# Altium footprint library PCBLIB.PcbLib: 557 footprints (part 29 of 36)
Each footprint in its own frame and in the unit in brackets; x right, y up, seen from the top. Pads: shape width x height; smd on the part's side, far side on the other; paste and mask are expansions set on the pad; w line width, h text height; cw(c..) or ccw(c..) is an arc to the next point about the centre after c.
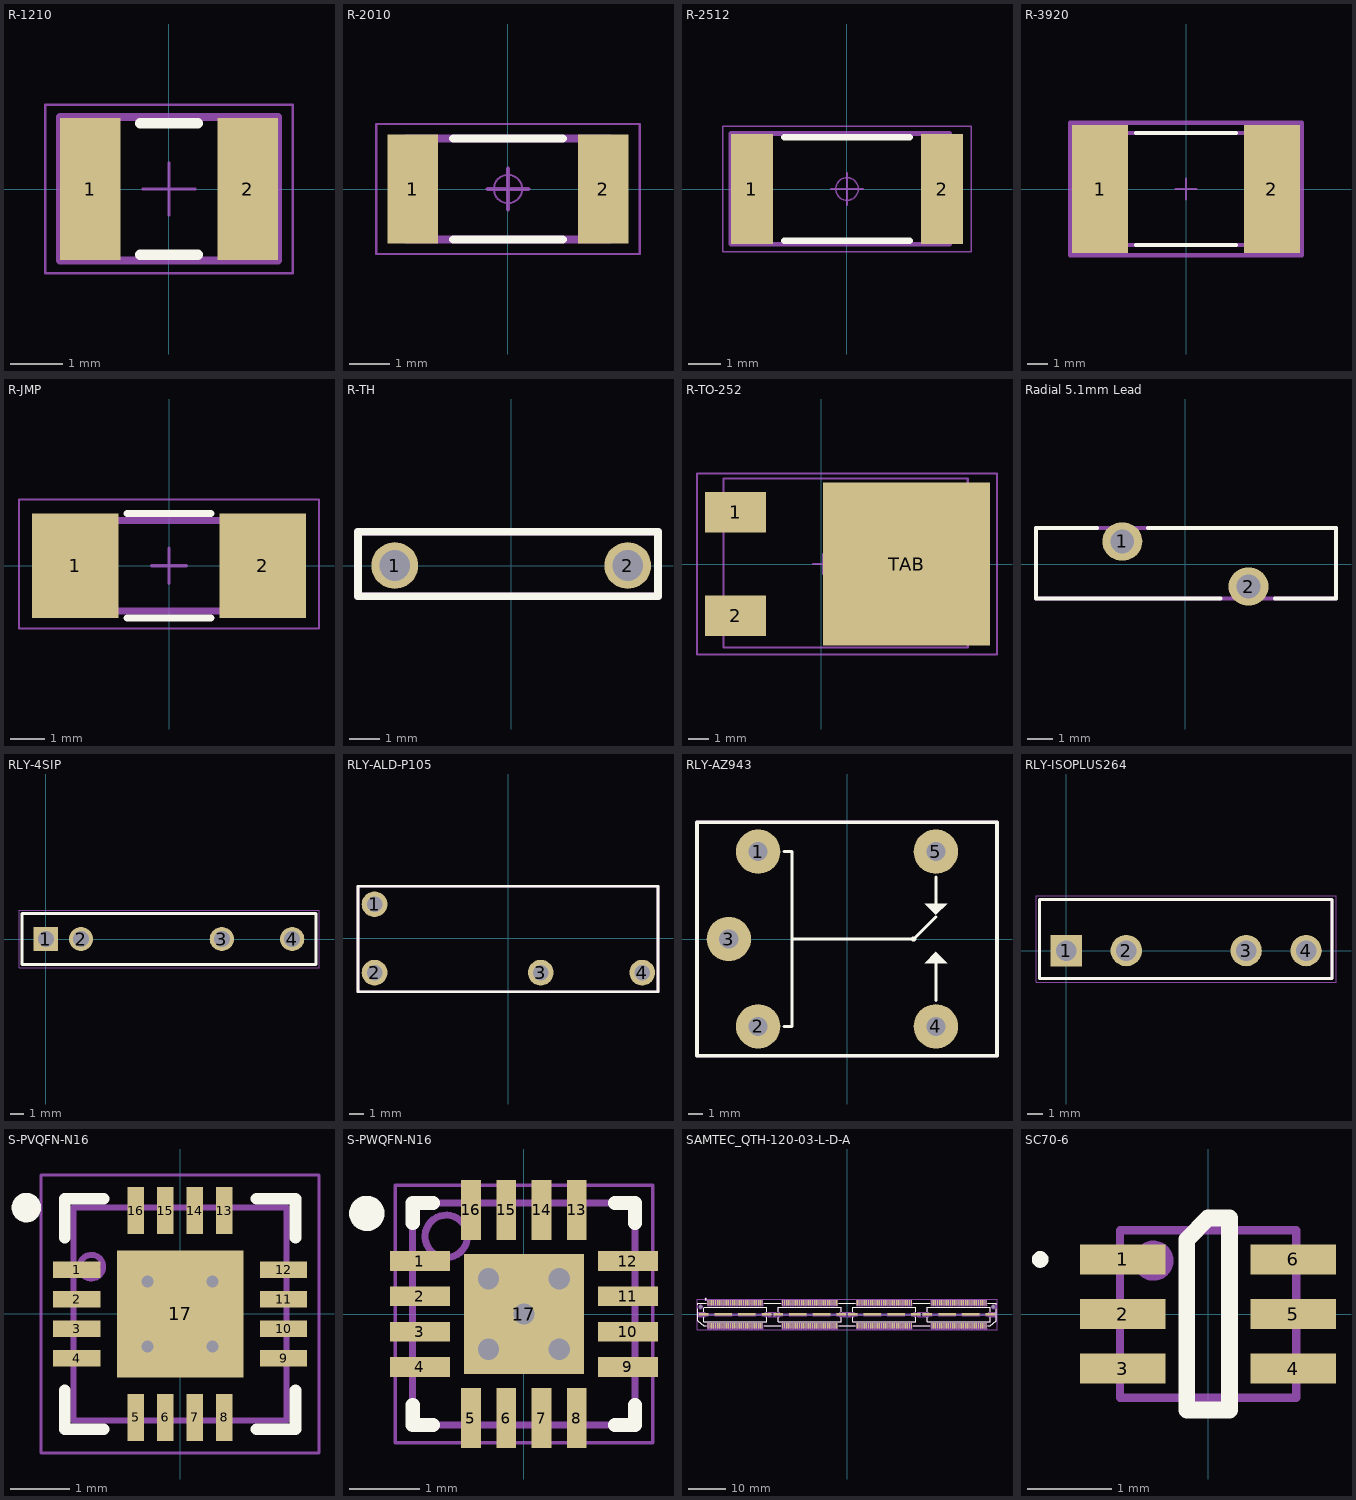
[diagram p28: the footprints below, top view; thin cyan lines are the x and y axes]

## R-1210 [mm]
pads (2):
  rect 1.15x2.7 smd: 1(-1.5,0) 2(1.5,0)
Top Overlay:
  lines w0.2: -0.55,-1.25 0.55,-1.25 ; -0.55,1.25 0.55,1.25
Mechanical 15:
  lines w0.05: -0.5,0 0.5,0 ; 0,-0.5 0,0.5 ; -2.35,-1.6 2.35,-1.6 2.35,1.6 -2.35,1.6 -2.35,-1.6
ASM Top:
  lines w0.152: -2.075,-1.358 2.075,-1.358 2.075,1.367 -2.075,1.367 -2.075,-1.358
  text ".designator" at -0.499,-0.247 h0.8
3D body "User Library-SMD RESISTOR-1.STEP": height 0.61, standoff 0.01, extent -1.6,-1.25 1.6,1.25

## R-2010 [mm]
height 0.65
pads (2):
  rect 1.25x2.7 smd: 1(-2.35,0) 2(2.35,0)
Top Overlay:
  lines w0.2: -1.35,-1.25 1.35,-1.25 ; -1.35,1.25 1.35,1.25
Mechanical 15:
  circle w0.05: c0,0 r0.35
  lines w0.05: -0.5,0 0.5,0 ; 0,-0.5 0,0.5 ; -3.25,-1.6 3.25,-1.6 3.25,1.6 -3.25,1.6 -3.25,-1.6
Mechanical 16:
  lines w0.1: -0.5,0 0.5,0 ; 0,-0.5 0,0.5
ASM Top:
  lines w0.2: -2.5,-1.25 -2.5,1.25 2.5,1.25 2.5,-1.25 -2.5,-1.25
  text ".designator" at -0.47,-0.181 h0.8
3D body "Res_TE_CRGP2010F820K_eec.STEP": height 0.65, standoff 0, extent -2.5,-1.25 2.5,1.25

## R-2512 [mm]
pads (2):
  rect 1.3x3.4 smd: 1(-2.95,0) 2(2.95,0)
Top Overlay:
  lines w0.2: -1.95,-1.6 1.95,-1.6 ; -1.95,1.6 1.95,1.6
Mechanical 15:
  circle w0.05: c0,0 r0.35
  lines w0.05: -0.5,0 0.5,0 ; 0,-0.5 0,0.5 ; -3.85,-1.95 3.85,-1.95 3.85,1.95 -3.85,1.95 -3.85,-1.95
ASM Top:
  lines w0.152: -3.6,-1.712 3.185,-1.712 3.185,1.725 -3.6,1.725 -3.6,-1.712
  text ".designator" at -0.85,-0.429 h0.8
3D body "RESC6332X80N.stp": height 0.8, standoff 0, extent -3.125,-1.6 3.125,1.6

## R-3920 [mm]
pads (2):
  rect 2.7x6.2 smd paste+0 mask+0: 1(-4.15,0) 2(4.15,0)
Top Overlay:
  lines w0.2: -2.425,-2.7 2.425,-2.7 ; -2.425,2.7 2.425,2.7
Mechanical 15:
  lines w0.2: -5.6,-3.2 -5.6,3.2 5.6,3.2 5.6,-3.2 -5.6,-3.2
Mechanical 16:
  lines w0.1: -0.5,0 0.5,0 ; 0,-0.5 0,0.5
ASM Top:
  lines w0.2: -5.2,-2.7 5.2,-2.7 5.2,2.7 -5.2,2.7 -5.2,-2.7
  text ".Designator" at 0,0.188 h1
3D body "Res_Stackpole_Electronics_HCS3920FT1L00_eec.STEP": height 1.07, standoff 0, extent -5.1,-2.6 5.1,2.6

## R-JMP [mm] "Chip Resistor, 2-Leads, Body 6.85x2.00mm, IPC Medium Density"
height 0.97
pads (2):
  rect 2.475x3 smd: 1(-2.688,0) 2(2.688,0)
Top Overlay:
  lines w0.2: -1.2,-1.5 1.2,-1.5 ; -1.2,1.5 1.2,1.5
Mechanical 15:
  lines w0.05: -4.3,-1.8 4.3,-1.8 4.3,1.9 -4.3,1.9 -4.3,-1.8
  lines w0.1: -0.5,0 0.5,0 ; 0,-0.5 0,0.5
ASM Top:
  lines w0.2: -3.4,-1.3 3.3,-1.3 3.3,1.3 3.1,1.3 -3.4,1.3 -3.4,-1.3
  text ".designator" at -0.5,-0.3 h0.8
3D body "s1911-46r.stp": height 0.98, standoff 0.01, extent -3.425,-1.25 3.425,1.257

## R-TH [mil]
pads (2):
  round 60 hole 39.37: 1(-149.61,0) 2(150,0)
Top Overlay:
  lines w10: -196.85,-39.37 -196.85,43.31 188.98,43.31 188.98,-39.37 -196.85,-39.37
Bottom Overlay:
  lines w10: -196.85,-39.37 -196.85,43.31 188.98,43.31 188.98,-39.37 -196.85,-39.37
Top 3D Body:
  lines w10: -196.85,-39.37 -196.85,0 -196.85,43.31 188.98,43.31 188.98,-39.37 -196.85,-39.37
ASM Top:
  lines w5.91: -196.85,-39.37 188.98,-39.37 188.98,43.31 -196.85,43.31 -196.85,-39.37
  text ".designator" at -31.5,-11.81 h31.5
3D body "CircuitWorks-RESISTOR 7_62MM DIP.STEP": height 157.98, standoff 0.5, extent -157.48,-39.37 161.42,39.37

## R-TO-252 [mm]
pads (3):
  rect 3x2 smd paste-0.05: 1(-4.2,2.54) 2(-4.2,-2.54)
  rect 8.2x8 smd paste-10: TAB(4.2,0)
Top Paste:
  rectangle: 5.715,2.159 8.128,3.683
  rectangle: 5.715,0.212 8.128,1.736
  rectangle: 5.715,-1.736 8.128,-0.212
  rectangle: 5.715,-3.683 8.128,-2.159
  rectangle: 2.984,2.159 5.397,3.683
  rectangle: 2.984,0.212 5.397,1.736
  rectangle: 2.984,-1.736 5.397,-0.212
  rectangle: 2.984,-3.683 5.397,-2.159
  rectangle: 0.254,-3.683 2.667,-2.159
  rectangle: 0.254,-1.736 2.667,-0.212
  rectangle: 0.254,0.212 2.667,1.736
  rectangle: 0.254,2.159 2.667,3.683
Mechanical 15:
  lines w0.1: -0.4,0 0.6,0 ; 0.1,-0.5 0.1,0.5 ; -6.096,-4.445 8.636,-4.445 8.636,4.445 -6.096,4.445 -6.096,-4.445
ASM Top:
  lines w0.1: -4.8,-4.1 -4.8,4.2 7.2,4.2 7.2,-4.1 -4.8,-4.1
  text ".designator" at 0,0 h0.8
3D body "TKH45PR500JE-TR.stp": height 0.92, standoff 0.01, extent -4.78,-4.15 7.22,4.15

## Radial 5.1mm Lead [mm] "Poly Puse"
pads (2):
  oval 1.6x1.524 hole 0.95: 1(-2.525,0.903) 2(2.525,-0.903)
Top Overlay:
  lines w0.152: -3.527,1.436 -5.976,1.436 -5.976,-1.383 ; -1.503,1.434 -1.501,1.436 6.024,1.436 6.024,-1.383 3.576,-1.383 3.573,-1.38 ; 1.41,-1.384 -5.976,-1.384 ; -5.976,-1.383 -5.976,-1.384
ASM Top:
  lines w0.15: -5.976,1.436 6.024,1.436 6.024,-1.383 -5.976,-1.383 -5.976,1.4 ; -5.976,1.4 -5.976,1.4
  text ".designator" at -1,-0.1 h0.8
3D body "User Library-MF-R250.STEP": height 18.3, standoff -7.6, extent -5.976,-1.383 6.024,1.436

## RLY-4SIP [mm]
pads (4):
  rect 1.75x1.75 hole 1.15: 1(0,0)
  round 1.75 hole 1.15: 2(2.54,0) 3(12.7,0) 4(17.78,0)
Top Overlay:
  lines w0.2: -1.71,-1.85 -1.71,1.85 19.49,1.85 19.49,-1.85 -1.71,-1.85
Mechanical 15:
  lines w0.05: -1.935,-2.075 -1.935,2.075 19.715,2.075 19.715,-2.075 -1.935,-2.075
ASM Top:
  lines w0.1: -1.71,-1.85 19.49,-1.85 19.49,1.85 -1.71,1.85 -1.71,-1.85
  text ".designator" at 7.1,0 h1.5
3D body: height 12.6, standoff 1.4, extent -1.71,-1.85 19.49,1.85

## RLY-ALD-P105 [mil]
pads (4):
  round 70 hole 42: 1(-364,93) 2(-364,-93) 3(88,-93) 4(364,-93)
Top Overlay:
  lines w8: -409,-145 -409,142 403,142 407,142 407,-145 -409,-145
ASM Top:
  lines w8: -409,-145 -409,142 407,142 407,-145 -409,-145
  text ".designator" at -301,-11 h31.5
3D body: height 602.36, standoff 11.81, extent -400.54,-146.73 406.54,136.74

## RLY-AZ943 [mil]
pads (5):
  round 120 hole 52: 1(-240,236) 2(-240,-236) 3(-319,0) 4(240,-236) 5(240,236)
Top Overlay:
  circle w4: c180,0 r5.39
  region: 270,-65 240,-35 210,-65
  region: 279,95
  region: 210,95 240,65 270,95
  lines w8: -170,-236 -149,-236 -149,236 -170,236 ; -147,0 180,0 240,60 ; 240,-166 240,-64 ; 240,94 240,114 240,167
  lines w10: -405,-315 -405,315 405,315 405,-315 -405,-315
ASM Top:
  lines w10: -405,315 405,315 405,-315 -405,-315 -405,314 -404,315
  text ".designator" at -244,78 h31.5
3D body "AZ943-1CH-5DE-Relay.step": height 602.36, standoff -196.85, extent -376,-305.23 375.97,305

## RLY-ISOPLUS264 [mm] "SIL, 4-Leads, Body 21x3.5mm"
height 12.6
pads (4):
  rect 2x2 hole 1.3: 1(0,0)
  round 2 hole 1.3: 2(3.81,0) 3(11.43,0) 4(15.24,0)
Top Overlay:
  lines w0.2: -1.71,-1.778 -1.71,3.247 16.891,3.247 16.891,-1.778 -1.71,-1.778
Mechanical 13:
  lines w0.1: -1.71,-1.778 16.891,-1.778 16.891,3.247 -1.71,3.247 -1.71,-1.778
Mechanical 15:
  lines w0.05: -1.935,-2 -1.935,3.472 17.145,3.472 17.145,-2 -1.935,-2
ASM Top:
  lines w0.2: -1.71,3.247 -1.71,-1.778 16.891,-1.778 16.891,3.247
  text ".designator" at 6.4,0.7 h1.5

## S-PVQFN-N16 [mm] "QFN, 16-Leads, Body 3,50x3,50mm, Pitch 0,50mm, Thermal Pad 2,14x2,14mm, IPC Medium Density"
height 1
pads (17):
  rect 0.8x0.28 smd: 1(-1.75,0.75) 2(-1.75,0.25) 3(-1.75,-0.25) 4(-1.75,-0.75) 9(1.75,-0.75) 10(1.75,-0.25) 11(1.75,0.25) 12(1.75,0.75)
  rect 0.28x0.8 smd: 5(-0.75,-1.75) 6(-0.25,-1.75) 7(0.25,-1.75) 8(0.75,-1.75) 13(0.75,1.75) 14(0.25,1.75) 15(-0.25,1.75) 16(-0.75,1.75)
  rect 2.14x2.14 smd: 17(0,0)
via -0.55,0.55 diameter 0.5 hole 0.2
via 0.55,0.55 diameter 0.5 hole 0.2
via -0.55,-0.55 diameter 0.5 hole 0.2
via 0.55,-0.55 diameter 0.5 hole 0.2
Top Overlay:
  circle w0.25: c-2.6,1.8 r0.125
  lines w0.2: -1.95,-1.29 -1.95,-1.95 -1.29,-1.95 ; -1.95,1.29 -1.95,1.95 -1.29,1.95 ; 1.29,-1.95 1.95,-1.95 1.95,-1.29 ; 1.29,1.95 1.95,1.95 1.95,1.29
Mechanical 15:
  lines w0.05: -2.35,-2.35 -2.35,2.35 2.35,2.35 2.35,-2.35 -2.35,-2.35
  lines w0.1: -0.5,0 0.5,0 ; 0,-0.5 0,0.5
ASM Top:
  circle w0.1: c-1.5,0.8 r0.2
  lines w0.1: -1.8,-1.8 -1.8,1.8 1.8,1.8 1.8,-1.8 -1.8,-1.8
  text ".designator" at -1.5,-0.6 h0.8
3D body "S-PVQFN-N16.step": height 1, standoff 0, extent -1.88,-1.88 1.88,1.88

## S-PWQFN-N16 [mm] "PQFN, 16-Leads, Body 3,00x3,00mm, Pitch 0,50mm, Thermal Pad 1,70x1,70mm, IPC Medium Density"
height 0.8
pads (17):
  rect 0.85x0.28 smd: 1(-1.475,0.75) 2(-1.475,0.25) 3(-1.475,-0.25) 4(-1.475,-0.75) 9(1.475,-0.75) 10(1.475,-0.25) 11(1.475,0.25) 12(1.475,0.75)
  rect 0.28x0.85 smd: 5(-0.75,-1.475) 6(-0.25,-1.475) 7(0.25,-1.475) 8(0.75,-1.475) 13(0.75,1.475) 14(0.25,1.475) 15(-0.25,1.475) 16(-0.75,1.475)
  rect 1.7x1.7 smd: 17(0,0)
via -0.5,0.5 diameter 0.3 hole 0.3
via 0.5,0.5 diameter 0.3 hole 0.3
via 0.5,-0.5 diameter 0.3 hole 0.3
via -0.5,-0.5 diameter 0.3 hole 0.3
via 0,0 diameter 0.3 hole 0.3
Top Overlay:
  circle w0.25: c-2.225,1.425 r0.125
  lines w0.2: -1.575,-1.29 -1.575,-1.575 -1.29,-1.575 ; -1.575,1.29 -1.575,1.575 -1.29,1.575 ; 1.29,-1.575 1.575,-1.575 1.575,-1.29 ; 1.29,1.575 1.575,1.575 1.575,1.29
Mechanical 15:
  lines w0.05: -1.825,-1.825 1.825,-1.825 1.825,1.825 -1.825,1.825 -1.825,-1.825
  lines w0.1: -0.5,0 0.5,0 ; 0,-0.5 0,0.5
ASM Top:
  circle w0.1: c-1.1,1.1 r0.3
  lines w0.1: -1.575,-1.575 1.575,-1.575 1.575,1.575 -1.575,1.575 -1.575,-1.575
  text ".designator" at -1.4,-0.9 h0.8
3D body "S-PWQFN-N16.step": height 0.8, standoff 0, extent -1.575,-1.575 1.575,1.575

## SAMTEC_QTH-120-03-L-D-A [mm] "240  (4x60) Contacts, Pitch 0.5mm, Straight Double Row High Speed Ground Plane Header (Lead Style 10.27mm)"
height 10.27
pads (258):
  rect 0.305x1.45 smd mask+0: 1(-37.255,3.086) 2(-37.255,-3.086) 3(-36.755,3.086) 4(-36.755,-3.086) 5(-36.255,3.086) 6(-36.255,-3.086) 7(-35.755,3.086) 8(-35.755,-3.086) 9(-35.255,3.086) 10(-35.255,-3.086) 11(-34.755,3.086) 12(-34.755,-3.086) 13(-34.255,3.086) 14(-34.255,-3.086) 15(-33.755,3.086) 16(-33.755,-3.086) 17(-33.255,3.086) 18(-33.255,-3.086) 19(-32.755,3.086) 20(-32.755,-3.086) 21(-32.255,3.086) 22(-32.255,-3.086) 23(-31.755,3.086) 24(-31.755,-3.086) 25(-31.255,3.086) 26(-31.255,-3.086) 27(-30.755,3.086) 28(-30.755,-3.086) 29(-30.255,3.086) 30(-30.255,-3.086) 31(-29.755,3.086) 32(-29.755,-3.086) 33(-29.255,3.086) 34(-29.255,-3.086) 35(-28.755,3.086) 36(-28.755,-3.086) 37(-28.255,3.086) 38(-28.255,-3.086) 39(-27.755,3.086) 40(-27.755,-3.086) 41(-27.255,3.086) 42(-27.255,-3.086) 43(-26.755,3.086) 44(-26.755,-3.086) 45(-26.255,3.086) 46(-26.255,-3.086) 47(-25.755,3.086) 48(-25.755,-3.086) 49(-25.255,3.086) 50(-25.255,-3.086) 51(-24.755,3.086) 52(-24.755,-3.086) 53(-24.255,3.086) 54(-24.255,-3.086) 55(-23.755,3.086) 56(-23.755,-3.086) 57(-23.255,3.086) 58(-23.255,-3.086) 59(-22.755,3.086) 60(-22.755,-3.086) 61(-17.252,3.086) 62(-17.252,-3.086) 63(-16.752,3.086) 64(-16.752,-3.086) 65(-16.252,3.086) 66(-16.252,-3.086) 67(-15.752,3.086) 68(-15.752,-3.086) 69(-15.252,3.086) 70(-15.252,-3.086) 71(-14.752,3.086) 72(-14.752,-3.086) 73(-14.252,3.086) 74(-14.252,-3.086) 75(-13.752,3.086) 76(-13.752,-3.086) 77(-13.252,3.086) 78(-13.252,-3.086) 79(-12.752,3.086) 80(-12.752,-3.086) 81(-12.252,3.086) 82(-12.252,-3.086) 83(-11.752,3.086) 84(-11.752,-3.086) 85(-11.252,3.086) 86(-11.252,-3.086) 87(-10.752,3.086) 88(-10.752,-3.086) 89(-10.252,3.086) 90(-10.252,-3.086) 91(-9.752,3.086) 92(-9.752,-3.086) 93(-9.252,3.086) 94(-9.252,-3.086) 95(-8.752,3.086) 96(-8.752,-3.086) 97(-8.252,3.086) 98(-8.252,-3.086) 99(-7.752,3.086) 100(-7.752,-3.086) 101(-7.252,3.086) 102(-7.252,-3.086) 103(-6.752,3.086) 104(-6.752,-3.086) 105(-6.252,3.086) 106(-6.252,-3.086) 107(-5.752,3.086) 108(-5.752,-3.086) 109(-5.252,3.086) 110(-5.252,-3.086) 111(-4.752,3.086) 112(-4.752,-3.086) 113(-4.252,3.086) 114(-4.252,-3.086) 115(-3.752,3.086) 116(-3.752,-3.086) 117(-3.252,3.086) 118(-3.252,-3.086) 119(-2.752,3.086) 120(-2.752,-3.086) 121(2.752,3.086) 122(2.752,-3.086) 123(3.251,3.086) 124(3.251,-3.086) 125(3.751,3.086) 126(3.751,-3.086) 127(4.252,3.086) 128(4.252,-3.086) 129(4.751,3.086) 130(4.751,-3.086) 131(5.252,3.086) 132(5.252,-3.086) 133(5.751,3.086) 134(5.751,-3.086) 135(6.251,3.086) 136(6.251,-3.086) 137(6.752,3.086) 138(6.752,-3.086) 139(7.251,3.086) 140(7.251,-3.086) 141(7.752,3.086) 142(7.752,-3.086) 143(8.251,3.086) 144(8.251,-3.086) 145(8.751,3.086) 146(8.751,-3.086) 147(9.252,3.086) 148(9.252,-3.086) 149(9.751,3.086) 150(9.751,-3.086) 151(10.252,3.086) 152(10.252,-3.086) 153(10.751,3.086) 154(10.751,-3.086) 155(11.251,3.086) 156(11.251,-3.086) 157(11.752,3.086) 158(11.752,-3.086) 159(12.251,3.086) 160(12.251,-3.086) 161(12.751,3.086) 162(12.751,-3.086) 163(13.252,3.086) 164(13.252,-3.086) 165(13.751,3.086) 166(13.751,-3.086) 167(14.252,3.086) 168(14.252,-3.086) 169(14.751,3.086) 170(14.751,-3.086) 171(15.251,3.086) 172(15.251,-3.086) 173(15.752,3.086) 174(15.752,-3.086) 175(16.251,3.086) 176(16.251,-3.086) 177(16.751,3.086) 178(16.751,-3.086) 179(17.252,3.086) 180(17.252,-3.086) 181(22.755,3.086) 182(22.755,-3.086) 183(23.255,3.086) 184(23.255,-3.086) 185(23.755,3.086) 186(23.755,-3.086) 187(24.255,3.086) 188(24.255,-3.086) 189(24.755,3.086) 190(24.755,-3.086) 191(25.255,3.086) 192(25.255,-3.086) 193(25.755,3.086) 194(25.755,-3.086) 195(26.255,3.086) 196(26.255,-3.086) 197(26.755,3.086) 198(26.755,-3.086) 199(27.255,3.086) 200(27.255,-3.086) 201(27.755,3.086) 202(27.755,-3.086) 203(28.255,3.086) 204(28.255,-3.086) 205(28.755,3.086) 206(28.755,-3.086) 207(29.255,3.086) 208(29.255,-3.086) 209(29.755,3.086) 210(29.755,-3.086) 211(30.255,3.086) 212(30.255,-3.086) 213(30.755,3.086) 214(30.755,-3.086) 215(31.255,3.086) 216(31.255,-3.086) 217(31.755,3.086) 218(31.755,-3.086) 219(32.255,3.086) 220(32.255,-3.086) 221(32.755,3.086) 222(32.755,-3.086) 223(33.255,3.086) 224(33.255,-3.086) 225(33.755,3.086) 226(33.755,-3.086) 227(34.255,3.086) 228(34.255,-3.086) 229(34.755,3.086) 230(34.755,-3.086) 231(35.255,3.086) 232(35.255,-3.086) 233(35.755,3.086) 234(35.755,-3.086) 235(36.255,3.086) 236(36.255,-3.086) 237(36.755,3.086) 238(36.755,-3.086) 239(37.255,3.086) 240(37.255,-3.086)
  rect 2.54x0.64 smd mask+0: 241(-38.45,0) 244(-21.56,0) 245(-18.447,0) 248(-1.557,0) 249(1.557,0) 252(18.447,0) 253(21.56,0) 256(38.45,0)
  rect 4.7x0.64 smd mask+0: 242(-33.18,0) 243(-26.83,0) 246(-13.177,0) 247(-6.827,0) 250(6.827,0) 251(13.177,0) 254(26.83,0) 255(33.18,0)
  round 0.5 hole 1 unplated mask+0.25: 257(-39.245,2.032) 258(39.245,2.032)
Top Overlay:
  circle w0.25: c-37.897,4.047 r0.125
  lines w0.2: -39.977,1.509 -39.977,-1.639 -38.454,-2.982 -37.807,-2.982 ; -39.977,2.555 -39.977,2.982 -37.807,2.982 ; -38.424,-0.72 -38.424,-1.967 -21.543,-1.967 -21.543,-0.72 ; -38.424,0.72 -38.424,1.664 ; -38.347,1.967 -21.543,1.967 -21.543,0.72 ; -22.202,-2.982 -17.804,-2.982 ; -22.202,2.982 -17.804,2.982 ; -18.437,-0.72 -18.437,-1.967 -1.556,-1.967 -1.556,-0.72 ; -18.437,0.72 -18.437,1.967 -1.556,1.967 -1.556,0.72 ; -2.199,-2.982 2.199,-2.982 ; -2.199,2.982 2.199,2.982 ; 1.551,-0.72 1.551,-1.967 18.431,-1.967 18.431,-0.72 ; 1.551,0.72 1.551,1.967 18.431,1.967 18.431,0.72 ; 17.804,-2.982 22.202,-2.982 ; 17.804,2.982 22.202,2.982 ; 21.538,-0.72 21.538,-1.967 38.419,-1.967 38.419,-0.72 ; 21.538,0.72 21.538,1.967 38.347,1.967 ; 37.807,-2.982 38.449,-2.982 39.972,-1.639 39.972,1.502 ; 37.807,2.982 39.972,2.982 39.972,2.562 ; 38.419,0.72 38.419,1.675
Mechanical 8:
  drawing of 1550 lines, arcs and shapes, not listed
Mechanical 14:
  circle w0.1: c-37.895,4.047 r0.25
  lines w0.1: -38.708,-0.19 -39.438,-0.19 -39.438,0.19 -38.708,0.19 ; -38.424,-0.571 -38.008,-0.571 -38.008,-0.193 -38.159,-0.193 -38.159,0.193 -38.008,0.193 -38.008,0.571 -38.424,0.571 ; -21.543,-0.571 -21.959,-0.571 -21.959,-0.193 -21.808,-0.193 -21.808,0.193 -21.959,0.193 -21.959,0.571 -21.543,0.571 ; -21.069,-0.19 -20.529,-0.19 -20.529,0.19 -21.069,0.19 ; -18.911,-0.19 -19.451,-0.19 -19.451,0.19 -18.911,0.19 ; -18.437,-0.571 -18.02,-0.571 -18.02,-0.193 -18.171,-0.193 -18.171,0.193 -18.02,0.193 -18.02,0.571 -18.437,0.571 ; -1.556,-0.571 -1.972,-0.571 -1.972,-0.193 -1.821,-0.193 -1.821,0.193 -1.972,0.193 -1.972,0.571 -1.556,0.571 ; -1.081,-0.19 -0.542,-0.19 -0.542,0.19 -1.081,0.19 ; 1.076,-0.19 0.537,-0.19 0.537,0.19 1.076,0.19 ; 1.551,-0.571 1.967,-0.571 1.967,-0.193 1.816,-0.193 1.816,0.193 1.967,0.193 1.967,0.571 1.551,0.571 ; 18.431,-0.571 18.015,-0.571 18.015,-0.193 18.166,-0.193 18.166,0.193 18.015,0.193 18.015,0.571 18.431,0.571 ; 18.906,-0.19 19.445,-0.19 19.445,0.19 18.906,0.19 ; 21.063,-0.19 20.524,-0.19 20.524,0.19 21.063,0.19 ; 21.538,-0.571 21.954,-0.571 21.954,-0.193 21.803,-0.193 21.803,0.193 21.954,0.193 21.954,0.571 21.538,0.571 ; 38.419,-0.571 38.003,-0.571 38.003,-0.193 38.154,-0.193 38.154,0.193 38.003,0.193 38.003,0.571 38.419,0.571 ; 38.703,-0.19 39.433,-0.19 39.433,0.19 38.703,0.19 ; -39.977,-1.639 -39.977,2.982 39.972,2.982 39.972,-1.639 38.449,-2.982 -38.454,-2.982 -39.977,-1.639 ; -39.723,-0.635 -39.723,0.631 -38.708,0.631 -38.708,-0.635 -39.723,-0.635 ; -38.424,-1.967 -38.424,1.967 -21.543,1.967 -21.543,-1.967 -38.424,-1.967 ; -38.156,-0.19 -38.156,0.19 -21.811,0.19 -21.811,-0.19 -38.156,-0.19 ; -21.069,-0.635 -21.069,0.635 -18.911,0.635 -18.911,-0.635 -21.069,-0.635 ; -18.437,-1.967 -18.437,1.967 -1.556,1.967 -1.556,-1.967 -18.437,-1.967 ; -18.169,-0.19 -18.169,0.19 -1.824,0.19 -1.824,-0.19 -18.169,-0.19 ; -1.081,-0.635 -1.081,0.635 1.076,0.635 1.076,-0.635 -1.081,-0.635 ; 1.551,-1.967 1.551,1.967 18.431,1.967 18.431,-1.967 1.551,-1.967 ; 1.819,-0.19 1.819,0.19 18.164,0.19 18.164,-0.19 1.819,-0.19 ; 18.906,-0.635 21.063,-0.635 21.063,0.635 18.906,0.635 18.906,-0.635 ; 21.538,-1.967 21.538,1.967 38.419,1.967 38.419,-1.967 21.538,-1.967 ; 21.806,-0.19 21.806,0.19 38.151,0.19 38.151,-0.19 21.806,-0.19 ; 38.703,-0.635 38.703,0.635 39.718,0.635 39.718,-0.635 38.703,-0.635
Mechanical 15:
  lines w0.05: -40.227,-4.061 40.222,-4.061 40.222,4.061 -40.227,4.061 -40.227,-4.061
3D body "SAMTEC_QTH-120-03-L-D-A.stp": height 10.27, standoff -0.73, extent -39.977,-3.553 39.972,3.553

## SC70-6 [mil] "SOT23, 6-Leads, Body 2,90x2,80mm, Pitch 0,95mm, IPC Medium Density"
height 39.37
pads (6):
  rect 40x14 smd: 1(-40,25.6) 2(-40,0) 3(-40,-25.6) 4(40,-25.6) 5(40,0) 6(40,25.6)
Top Overlay:
  circle w3.94: c-78.74,25.6 r1.97
  lines w7.87: -10,-44.99 10,-44.99 10,45.01 0,45.01 -10,35.01 -10,-44.99
ASM Top:
  circle w10: c-25.6,25.01 r4.4
  lines w3.94: -41.33,-39.37 41.35,-39.37 41.35,39.37 -41.33,39.37 -41.33,-39.37
  text ".designator" at -3.84,-0.74 h31.5
3D body "SC70-6.step": height 36.42, standoff -0.98, extent -41.33,-39.37 41.34,39.37